# Altium schematic symbol library Regulator_Switching.SchLib: 1120 symbols (part 4 of 8)
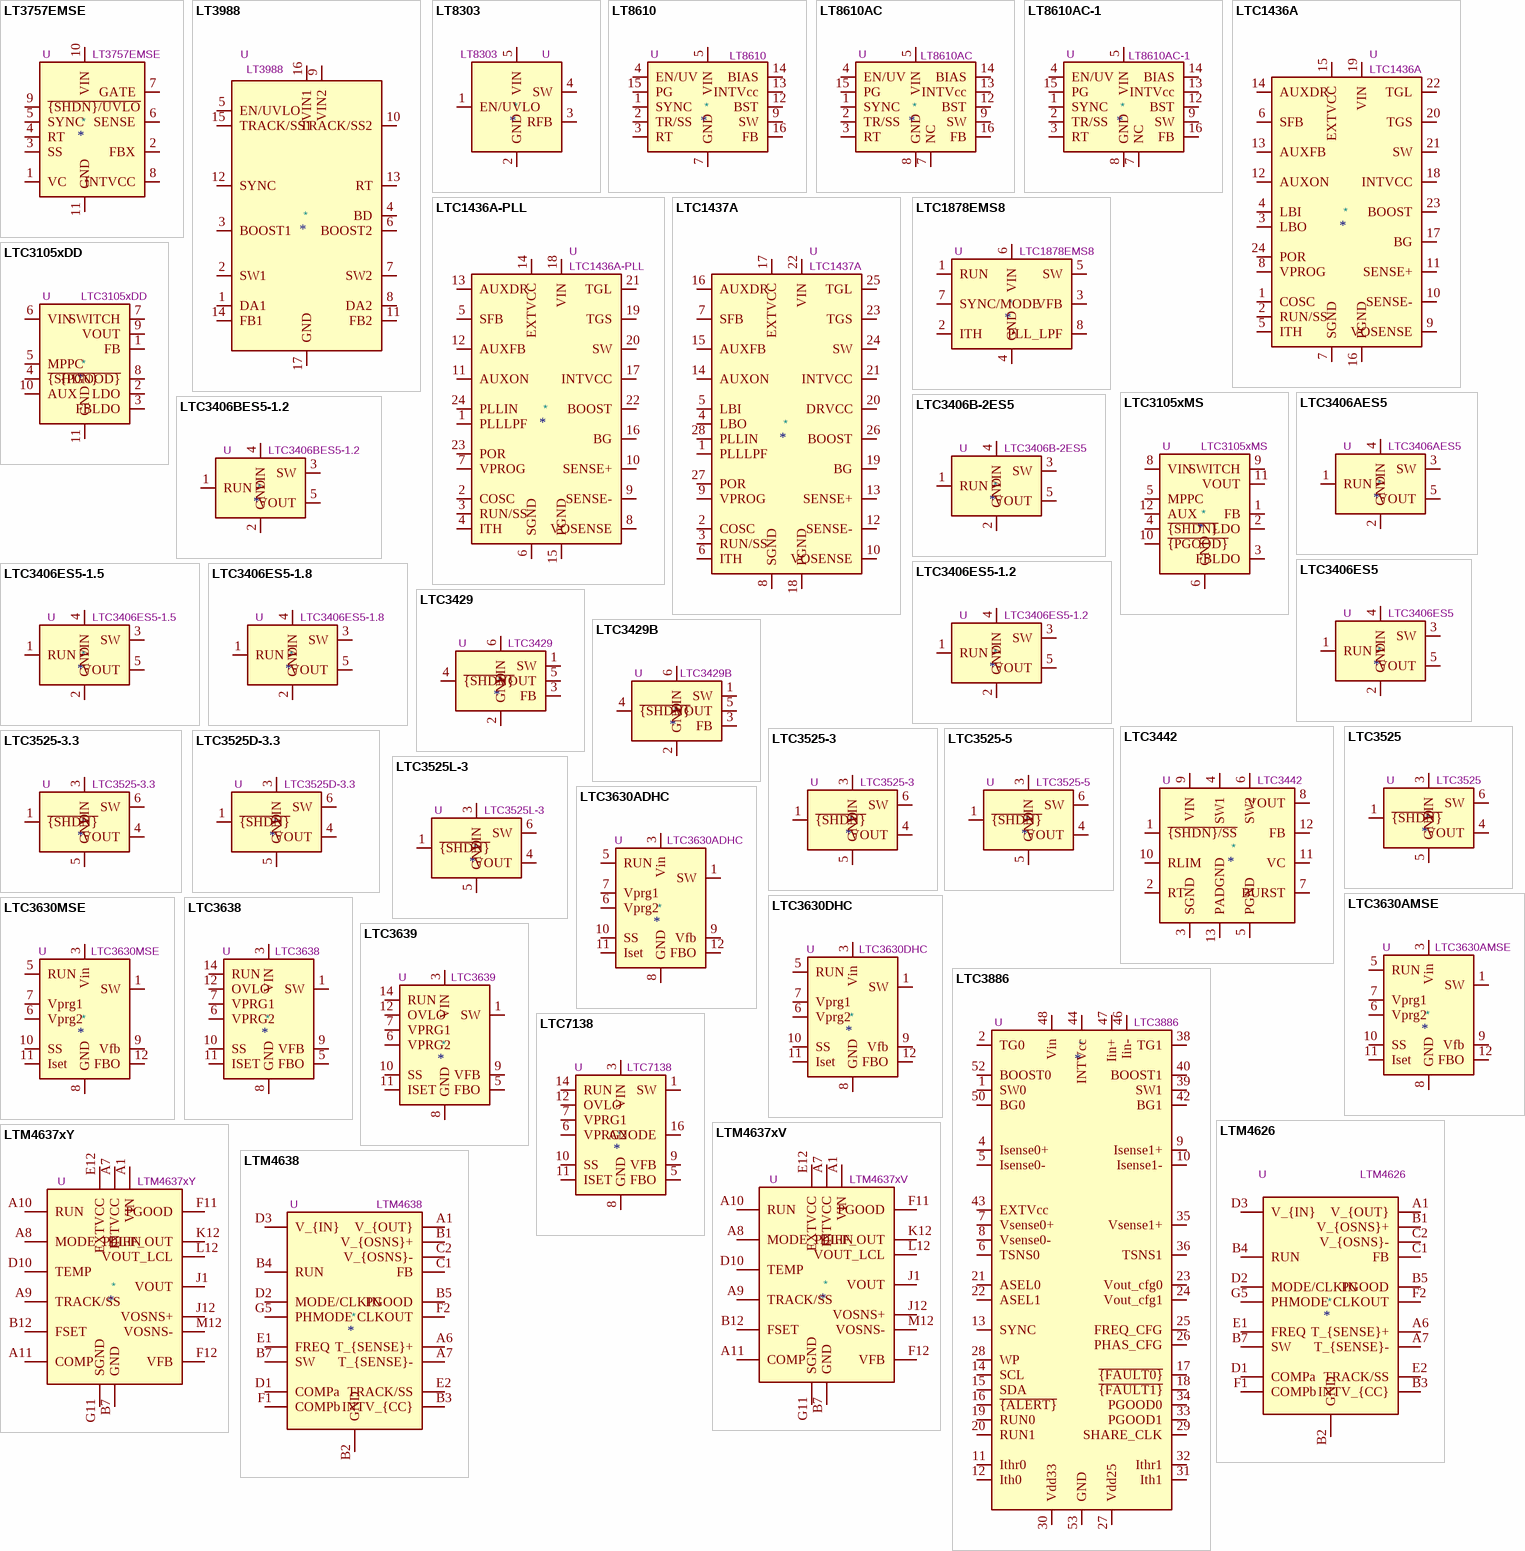
[diagram p30: symbols LT3757EMSE to LTM4638]

## LTC1878EMS8
designator *  value LTC1878EMS8  Reference: U
ki_keywords: Synchronous Step-Down Regulator; ki_description: High Efficiency Monolithic Synchronous Step-Down Regulator, MSOP-8; ki_fp_filters: MSOP*3x3mm*P0.65mm*; Footprint: Package_SO:MSOP-8_3x3mm_P0.65mm; Datasheet: https://www.analog.com/media/en/technical-documentation/data-sheets/1878f.pdf
pins: 1 RUN, 2 ITH, 3 VFB, 4 GND, 5 SW, 6 VIN, 7 SYNC/MODE, 8 PLL_LPF

## LTC3105xDD
designator *  value LTC3105xDD  Reference: U
ki_keywords: Solar MPPT Maximum Power Point Control Converter Step-Up; ki_description: 400mA Step-Up DC/DC Converter with Maximum Power Point Control and 250mV Start-Up, DFN-10; ki_fp_filters: DFN*EP*3x3mm*0.5mm*EP*; Footprint: Package_DFN_QFN:DFN-10-1EP_3x3mm_P0.5mm_EP1.65x2.38mm; Datasheet: https://www.analog.com/media/en/technical-documentation/data-sheets/3105fb.pdf
pins: 1 FB, 2 LDO, 3 FBLDO, 4 ~{{SHDN}}, 5 MPPC, 6 VIN, 7 SWITCH, 8 ~{{PGOOD}}, 9 VOUT, 10 AUX, 11 GND

## LTC3105xMS
designator *  value LTC3105xMS  Reference: U
ki_keywords: Solar MPPT Maximum Power Point Control Converter Step-Up; ki_description: 400mA Step-Up DC/DC Converter with Maximum Power Point Control and 250mV Start-Up, MSOP-12; ki_fp_filters: MSOP*3x4mm*0.65mm*; Footprint: Package_SO:MSOP-12_3x4mm_P0.65mm; Datasheet: https://www.analog.com/media/en/technical-documentation/data-sheets/3105fb.pdf
pins: 1 FB, 2 LDO, 3 FBLDO, 4 ~{{SHDN}}, 5 MPPC, 6 GND, 7 GND hidden, 8 VIN, 9 SWITCH, 10 ~{{PGOOD}}, 11 VOUT, 12 AUX

## LTC3406AES5
designator *  value LTC3406AES5  Reference: U
ki_keywords: Regulator step-down; ki_description: 600mA Synchronous Step-Down Regulator, 1.5MHz, Fixed 1.2V Output Voltage, Low Ripple Burst Mode, ThinSOT-23; ki_fp_filters: TSOT?23*; Footprint: Package_TO_SOT_SMD:TSOT-23-5; Datasheet: https://www.analog.com/media/en/technical-documentation/data-sheets/3406afa.pdf
pins: 1 RUN, 2 GND, 3 SW, 4 VIN, 5 VOUT

## LTC3406B-2ES5
designator *  value LTC3406B-2ES5  Reference: U
ki_keywords: Regulator step-down; ki_description: 600mA Synchronous Step-Down Regulator, 2.25MHz, Adjustable Output Voltage,ThinSOT-23; ki_fp_filters: TSOT?23*; Footprint: Package_TO_SOT_SMD:TSOT-23-5; Datasheet: https://www.analog.com/media/en/technical-documentation/data-sheets/3406b2fs.pdf
pins: 1 RUN, 2 GND, 3 SW, 4 VIN, 5 VOUT

## LTC3406BES5-1.2
designator *  value LTC3406BES5-1.2  Reference: U
ki_keywords: Regulator step-down; ki_description: 600mA Synchronous Step-Down Regulator, 1.5MHz, Fixed 1.2V Output Voltage, Burst Mode Disabled, ThinSOT-23; ki_fp_filters: TSOT?23*; Footprint: Package_TO_SOT_SMD:TSOT-23-5; Datasheet: https://www.analog.com/media/en/technical-documentation/data-sheets/3406b12fs.pdf
pins: 1 RUN, 2 GND, 3 SW, 4 VIN, 5 VOUT

## LTC3406ES5
designator *  value LTC3406ES5  Reference: U
ki_keywords: Regulator step-down; ki_description: 600mA Synchronous Step-Down Regulator, 1.5MHz, Adjustable Output Voltage, Burst Mode, ThinSOT-23; ki_fp_filters: TSOT?23*; Footprint: Package_TO_SOT_SMD:TSOT-23-5; Datasheet: https://www.analog.com/media/en/technical-documentation/data-sheets/3406b12fs.pdf
pins: 1 RUN, 2 GND, 3 SW, 4 VIN, 5 VOUT

## LTC3406ES5-1.2
designator *  value LTC3406ES5-1.2  Reference: U
ki_keywords: Regulator step-down; ki_description: 600mA Synchronous Step-Down Regulator, 1.5MHz, Fixed 1.2V Output Voltage, Burst Mode, ThinSOT-23; ki_fp_filters: TSOT?23*; Footprint: Package_TO_SOT_SMD:TSOT-23-5; Datasheet: https://www.analog.com/media/en/technical-documentation/data-sheets/3406b12fs.pdf
pins: 1 RUN, 2 GND, 3 SW, 4 VIN, 5 VOUT

## LTC3406ES5-1.5
designator *  value LTC3406ES5-1.5  Reference: U
ki_keywords: Regulator step-down; ki_description: 600mA Synchronous Step-Down Regulator, 1.5MHz, Fixed 1.5V Output Voltage, Burst Mode, ThinSOT-23; ki_fp_filters: TSOT?23*; Footprint: Package_TO_SOT_SMD:TSOT-23-5; Datasheet: https://www.analog.com/media/en/technical-documentation/data-sheets/3406b12fs.pdf
pins: 1 RUN, 2 GND, 3 SW, 4 VIN, 5 VOUT

## LTC3406ES5-1.8
designator *  value LTC3406ES5-1.8  Reference: U
ki_keywords: Regulator step-down; ki_description: 600mA Synchronous Step-Down Regulator, 1.5MHz, Fixed 1.8V Output Voltage, Burst Mode, ThinSOT-23; ki_fp_filters: TSOT?23*; Footprint: Package_TO_SOT_SMD:TSOT-23-5; Datasheet: https://www.analog.com/media/en/technical-documentation/data-sheets/3406b12fs.pdf
pins: 1 RUN, 2 GND, 3 SW, 4 VIN, 5 VOUT

## LTC3429
designator *  value LTC3429  Reference: U
ki_keywords: boost step-up DC/DC synchronous; ki_description: 600mA, 500kHz Micropower Synchronous Boost Converter with Output Disconnect, TSOT-23-6; ki_fp_filters: TSOT?23*; Footprint: Package_TO_SOT_SMD:TSOT-23-6; Datasheet: https://www.analog.com/media/en/technical-documentation/data-sheets/3429fa.pdf
pins: 1 SW, 2 GND, 3 FB, 4 ~{{SHDN}}, 5 VOUT, 6 VIN

## LTC3429B
designator *  value LTC3429B  Reference: U
ki_keywords: boost step-up DC/DC synchronous; ki_description: 600mA, 500kHz Micropower Synchronous Boost Converter with Output Disconnect, Continuous Switching at Light Loads, TSOT-23-6; ki_fp_filters: TSOT?23*; Footprint: Package_TO_SOT_SMD:TSOT-23-6; Datasheet: https://www.analog.com/media/en/technical-documentation/data-sheets/3429fa.pdf
pins: 1 SW, 2 GND, 3 FB, 4 ~{{SHDN}}, 5 VOUT, 6 VIN

## LTC3442
designator *  value LTC3442  Reference: U
ki_keywords: Micropower Synchronous Buck-Boost DC/DC Converter; ki_description: Micropower Synchronous Buck-Boost DC/DC Converter with Automatic Burst Mode Operation, DFN-12; ki_fp_filters: DFN*EP*3x4mm*P0.5mm*; Footprint: Package_DFN_QFN:DFN-12-1EP_3x4mm_P0.5mm_EP1.7x3.3mm; Datasheet: https://www.analog.com/media/en/technical-documentation/data-sheets/3442fb.pdf
pins: 1 ~{{SHDN}/SS}, 2 RT, 3 SGND, 4 SW1, 5 PGND, 6 SW2, 7 BURST, 8 VOUT, 9 VIN, 10 RLIM, 11 VC, 12 FB, 13 PADGND

## LTC3525
designator *  value LTC3525  Reference: U
ki_keywords: boost step-up DC/DC synchronous; ki_description: 400mA Micropower Synchronous Step-Up DC/DC Converter with Output Disconnect, SC-70-6; ki_fp_filters: *SC?70* SOT?363*; Footprint: Package_TO_SOT_SMD:SOT-363_SC-70-6; Datasheet: https://www.analog.com/media/en/technical-documentation/data-sheets/3525fc.pdf
pins: 1 ~{{SHDN}}, 2 GND hidden, 3 VIN, 4 VOUT, 5 GND, 6 SW

## LTC3525-3
designator *  value LTC3525-3  Reference: U
ki_keywords: fixed boost step-up DC/DC synchronous; ki_description: Fixed 3V, 400mA Micropower Synchronous Step-Up DC/DC Converter with Output Disconnect, SC-70-6; ki_fp_filters: *SC?70* SOT?363*; Footprint: Package_TO_SOT_SMD:SOT-363_SC-70-6; Datasheet: https://www.analog.com/media/en/technical-documentation/data-sheets/3525fc.pdf
pins: 1 ~{{SHDN}}, 2 GND hidden, 3 VIN, 4 VOUT, 5 GND, 6 SW

## LTC3525-3.3
designator *  value LTC3525-3.3  Reference: U
ki_keywords: fixed boost step-up DC/DC synchronous; ki_description: Fixed 3V3, 400mA Micropower Synchronous Step-Up DC/DC Converter with Output Disconnect, SC-70-6; ki_fp_filters: *SC?70* SOT?363*; Footprint: Package_TO_SOT_SMD:SOT-363_SC-70-6; Datasheet: https://www.analog.com/media/en/technical-documentation/data-sheets/3525fc.pdf
pins: 1 ~{{SHDN}}, 2 GND hidden, 3 VIN, 4 VOUT, 5 GND, 6 SW

## LTC3525-5
designator *  value LTC3525-5  Reference: U
ki_keywords: fixed boost step-up DC/DC synchronous; ki_description: Fixed 5V, 400mA Micropower Synchronous Step-Up DC/DC Converter with Output Disconnect, SC-70-6; ki_fp_filters: *SC?70* SOT?363*; Footprint: Package_TO_SOT_SMD:SOT-363_SC-70-6; Datasheet: https://www.analog.com/media/en/technical-documentation/data-sheets/3525fc.pdf
pins: 1 ~{{SHDN}}, 2 GND hidden, 3 VIN, 4 VOUT, 5 GND, 6 SW

## LTC3525D-3.3
designator *  value LTC3525D-3.3  Reference: U
ki_keywords: fixed boost step-up DC/DC synchronous; ki_description: Fixed 3V3, 400mA Micropower Synchronous Step-Up DC/DC Converter with Pass Through Mode, SC-70-6; ki_fp_filters: *SC?70* SOT?363*; Footprint: Package_TO_SOT_SMD:SOT-363_SC-70-6; Datasheet: https://www.analog.com/media/en/technical-documentation/data-sheets/3525d33fb.pdf
pins: 1 ~{{SHDN}}, 2 GND hidden, 3 VIN, 4 VOUT, 5 GND, 6 SW

## LTC3525L-3
designator *  value LTC3525L-3  Reference: U
ki_keywords: fixed boost step-up DC/DC synchronous; ki_description: Fixed 3V, 400mA Micropower Synchronous Step-Up DC/DC Converter with Output Disconnect, SC-70-6; ki_fp_filters: *SC?70* SOT?363*; Footprint: Package_TO_SOT_SMD:SOT-363_SC-70-6; Datasheet: https://www.analog.com/media/en/technical-documentation/data-sheets/3525laf.pdf
pins: 1 ~{{SHDN}}, 2 GND hidden, 3 VIN, 4 VOUT, 5 GND, 6 SW

## LTC3630ADHC
designator *  value LTC3630ADHC  Reference: U
ki_keywords: buck dc-dc switcher switching; ki_description: High efficiency 76V 500mA synchronous step-down converter, DFN-16; ki_fp_filters: DFN*EP*3x5mm*P0.5mm*; Footprint: Package_DFN_QFN:DFN-16-1EP_3x5mm_P0.5mm_EP1.66x4.4mm; Datasheet: https://www.analog.com/media/en/technical-documentation/data-sheets/3630afc.pdf
pins: 1 SW, 2 NC hidden, 3 Vin, 4 NC hidden, 5 RUN, 6 Vprg2, 7 Vprg1, 8 GND, 9 Vfb, 10 SS, 11 Iset, 12 FBO, 13 NC hidden, 14 GND hidden, 15 NC hidden, 16 GND hidden, 17 GND hidden

## LTC3630AMSE
designator *  value LTC3630AMSE  Reference: U
ki_keywords: buck dc-dc switcher switching; ki_description: High efficiency 76V 500mA synchronous step-down converter, MSOP-16(12); ki_fp_filters: Linear*MSOP*12*16*EP*3x4mm*P0.5mm*; Footprint: Package_SO:Linear_MSOP-12-16-1EP_3x4mm_P0.5mm; Datasheet: https://www.analog.com/media/en/technical-documentation/data-sheets/3630afc.pdf
pins: 1 SW, 3 Vin, 5 RUN, 6 Vprg2, 7 Vprg1, 8 GND, 9 Vfb, 10 SS, 11 Iset, 12 FBO, 14 GND hidden, 16 GND hidden, 17 GND hidden

## LTC3630DHC
designator *  value LTC3630DHC  Reference: U
ki_keywords: buck dc-dc switcher switching; ki_description: 500mA High efficiency 65V synchronous step-down converter, DFN-16; ki_fp_filters: DFN*EP*3x5mm*P0.5mm*; Footprint: Package_DFN_QFN:DFN-16-1EP_3x5mm_P0.5mm_EP1.66x4.4mm; Datasheet: https://www.analog.com/media/en/technical-documentation/data-sheets/3630fd.pdf
pins: 1 SW, 2 NC hidden, 3 Vin, 4 NC hidden, 5 RUN, 6 Vprg2, 7 Vprg1, 8 GND, 9 Vfb, 10 SS, 11 Iset, 12 FBO, 13 NC hidden, 14 GND hidden, 15 NC hidden, 16 GND hidden, 17 GND hidden

## LTC3630MSE
designator *  value LTC3630MSE  Reference: U
ki_keywords: buck dc-dc switcher switching; ki_description: 500mA High efficiency 65V synchronous step-down converter, MSOP-16(12); ki_fp_filters: Linear*MSOP*12*16*EP*3x4mm*P0.5mm*; Footprint: Package_SO:Linear_MSOP-12-16-1EP_3x4mm_P0.5mm; Datasheet: https://www.analog.com/media/en/technical-documentation/data-sheets/3630fd.pdf
pins: 1 SW, 3 Vin, 5 RUN, 6 Vprg2, 7 Vprg1, 8 GND, 9 Vfb, 10 SS, 11 Iset, 12 FBO, 14 GND hidden, 16 GND hidden, 17 GND hidden

## LTC3638
designator *  value LTC3638  Reference: U
ki_keywords: buck dc-dc switcher switching; ki_description: 250mA High efficiency 140V step-down converter, MSOP-16(12); ki_fp_filters: Linear*MSOP*12*16*EP*3x4mm*P0.5mm*; Footprint: Package_SO:Linear_MSOP-12-16-1EP_3x4mm_P0.5mm; Datasheet: https://www.analog.com/media/en/technical-documentation/data-sheets/3638fa.pdf
pins: 1 SW, 3 VIN, 5 FBO, 6 VPRG2, 7 VPRG1, 8 GND, 9 VFB, 10 SS, 11 ISET, 12 OVLO, 14 RUN, 16 GND hidden, 17 GND hidden

## LTC3639
designator *  value LTC3639  Reference: U
ki_keywords: buck dc-dc switcher switching; ki_description: 100mA High efficiency 150V syncrhonous step-down converter, MSOP-16(12); ki_fp_filters: Linear*MSOP*12*16*EP*3x4mm*P0.5mm*; Footprint: Package_SO:Linear_MSOP-12-16-1EP_3x4mm_P0.5mm; Datasheet: https://www.analog.com/media/en/technical-documentation/data-sheets/3639fd.pdf
pins: 1 SW, 3 VIN, 5 FBO, 6 VPRG2, 7 VPRG1, 8 GND, 9 VFB, 10 SS, 11 ISET, 12 OVLO, 14 RUN, 16 GND hidden, 17 GND hidden

## LTC3886
designator *  value LTC3886  Reference: U
ki_keywords: step down switch manager I2C telemetry fault current sense; ki_description: 60V dual output buck output with digital power system management, UKG52(46); ki_fp_filters: Linear*UGK52*QFN*46*52*; Footprint: Package_DFN_QFN:Linear_UGK52_QFN-46-52; Datasheet: https://www.analog.com/media/en/technical-documentation/data-sheets/LTC3886-3886-1.pdf
pins: 1 SW0, 2 TG0, 4 Isense0+, 5 Isense0-, 6 TSNS0, 7 Vsense0+, 8 Vsense0-, 9 Isense1+, 10 Isense1-, 11 Ithr0, 12 Ith0, 13 SYNC, 14 SCL, 15 SDA, 16 ~{{ALERT}}, 17 ~{{FAULT0}}, 18 ~{{FAULT1}}, 19 RUN0, 20 RUN1, 21 ASEL0, 22 ASEL1, 23 Vout_cfg0, 24 Vout_cfg1, 25 FREQ_CFG, 26 PHAS_CFG, 27 Vdd25, 28 WP, 29 SHARE_CLK, 30 Vdd33, 31 Ith1, 32 Ithr1, 33 PGOOD1, 34 PGOOD0, 35 Vsense1+, 36 TSNS1, 38 TG1, 39 SW1, 40 BOOST1, 42 BG1, 43 EXTVcc, 44 INTVcc, 46 Iin-, 47 Iin+, 48 Vin, 50 BG0, 52 BOOST0, 53 GND

## LTC7138
designator *  value LTC7138  Reference: U
ki_keywords: buck dc-dc switcher switching; ki_description: 400mA High efficiency 140V step-down converter, MSOP-16(12); ki_fp_filters: Linear*MSOP*12*16*EP*3x4mm*P0.5mm*; Footprint: Package_SO:Linear_MSOP-12-16-1EP_3x4mm_P0.5mm; Datasheet: https://www.analog.com/media/en/technical-documentation/data-sheets/7138f.pdf
pins: 1 SW, 3 VIN, 5 FBO, 6 VPRG2, 7 VPRG1, 8 GND, 9 VFB, 10 SS, 11 ISET, 12 OVLO, 14 RUN, 16 ANODE, 17 GND hidden

## LTM4626
designator *  value LTM4626  Reference: U
ki_keywords: uModule Buck Regulator; ki_description: Analog Devices 20VIN, 12A Step-Down DC/DC uModule Regulator, BGA-49; ki_fp_filters: *BGA*6.25x6.25mm*Layout7x7*P0.8mm*; Footprint: Package_BGA:Analog_BGA-49_6.25x6.25mm_Layout7x7_P0.8mm_Ball0.5mm_Pad0.4mm; Datasheet: https://www.analog.com/media/en/technical-documentation/data-sheets/ltm4626.pdf
pins: A1 V_{OUT}, A2 V_{OUT} hidden, A3 V_{OUT} hidden, A4 V_{OUT} hidden, A5 V_{OUT} hidden, A6 T_{SENSE}+, A7 T_{SENSE}-, B1 V_{OSNS}+, B2 GND, B3 INTV_{CC}, B4 RUN, B5 PGOOD, B6 GND hidden, B7 SW, C1 FB, C2 V_{OSNS}-, C3 GND hidden, C4 GND hidden, C5 GND hidden, C6 GND hidden, C7 GND hidden, D1 COMPa, D2 MODE/CLKIN, D3 V_{IN}, D4 V_{IN} hidden, D5 GND hidden, D6 GND hidden, D7 GND hidden, E1 FREQ, E2 TRACK/SS, E3 V_{IN} hidden, E4 V_{IN} hidden, E5 GND hidden, E6 GND hidden, E7 GND hidden, F1 COMPb, F2 CLKOUT, F3 V_{OUT} hidden, F4 V_{IN} hidden, F5 GND hidden, F6 GND hidden, F7 GND hidden, G1 V_{OUT} hidden, G2 V_{OUT} hidden, G3 V_{OUT} hidden, G4 V_{IN} hidden, G5 PHMODE, G6 GND hidden, G7 GND hidden

## LTM4637xV
designator *  value LTM4637xV  Reference: U
ki_keywords: uModule DCDC; ki_description: 20A DC/DC µModule Step-Down Regulator, LGA-133; ki_fp_filters: Linear*LGA*15.0x15.0mm*Layout12x12*P1.27mm*; Footprint: Package_LGA:Linear_LGA-133_15.0x15.0mm_Layout12x12_P1.27mm; Datasheet: https://www.analog.com/media/en/technical-documentation/data-sheets/4637fc.pdf
pins: A1 VIN, A2 VIN hidden, A3 VIN hidden, A4 VIN hidden, A5 VIN hidden, A6 VIN hidden, A7 INTVCC, A8 MODE_PLLIN, A9 TRACK/SS, A10 RUN, A11 COMP, A12 MTP1 hidden, B1 VIN hidden, B2 VIN hidden, B3 VIN hidden, B4 VIN hidden, B5 VIN hidden, B6 VIN hidden, B7 GND, B9 GND hidden, B11 MTP2 hidden, B12 FSET, C1 VIN hidden, C2 VIN hidden, C3 VIN hidden, C4 VIN hidden, C5 VIN hidden, C6 VIN hidden, C7 GND hidden, C9 GND hidden, C10 MTP3 hidden, C11 MTP4 hidden, C12 MTP5 hidden, D1 GND hidden, D2 GND hidden, D3 GND hidden, D4 GND hidden, D5 GND hidden, D6 GND hidden, D8 GND hidden, D9 INTVCC hidden, D10 TEMP, D11 MTP6 hidden, D12 MTP7 hidden, E1 GND hidden, E2 GND hidden, E3 GND hidden, E4 GND hidden, E5 GND hidden, E6 GND hidden, E7 GND hidden, E9 GND hidden, E12 EXTVCC, F1 GND hidden, F2 GND hidden, F3 GND hidden, F4 GND hidden, F5 GND hidden, F6 GND hidden, F7 GND hidden, F8 GND hidden, F9 GND hidden, F11 PGOOD, F12 VFB, G1 GND hidden, G2 GND hidden, G3 GND hidden, G4 GND hidden, G5 GND hidden, G6 GND hidden, G7 GND hidden, G8 GND hidden, G9 GND hidden, G11 SGND, G12 PGOOD hidden, H1 GND hidden, H2 GND hidden, H3 GND hidden, H4 GND hidden, H5 GND hidden, H6 GND hidden, H7 GND hidden, H8 GND hidden, H9 GND hidden, H11 SGND hidden, H12 SGND hidden, J1 VOUT, J2 VOUT hidden, J3 VOUT hidden, J4 VOUT hidden, J5 VOUT hidden, J6 VOUT hidden, J7 VOUT hidden, J8 VOUT hidden, J9 VOUT hidden, J10 VOUT hidden, J12 VOSNS+, K1 VOUT hidden, K2 VOUT hidden, K3 VOUT hidden, K4 VOUT hidden, K5 VOUT hidden, K6 VOUT hidden, K7 VOUT hidden, K8 VOUT hidden, K9 VOUT hidden, K10 VOUT hidden, K11 VOUT hidden, K12 DIFF_OUT, L1 VOUT hidden, L2 VOUT hidden, L3 VOUT hidden, L4 VOUT hidden, L5 VOUT hidden, L6 VOUT hidden, L7 VOUT hidden, L8 VOUT hidden, L9 VOUT hidden, L10 VOUT hidden, L11 VOUT hidden, L12 VOUT_LCL, M1 VOUT hidden, M2 VOUT hidden, M3 VOUT hidden, M4 VOUT hidden, M5 VOUT hidden, M6 VOUT hidden, M7 VOUT hidden, M8 VOUT hidden, M9 VOUT hidden, M10 VOUT hidden, M11 VOUT hidden, M12 VOSNS-

## LTM4637xY
designator *  value LTM4637xY  Reference: U
ki_keywords: uModule DCDC; ki_description: 20A DC/DC µModule Step-Down Regulator, BGA-133; ki_fp_filters: Linear*BGA*15.0x15.0mm*Layout12x12*P1.27mm*; Footprint: Package_BGA:Linear_BGA-133_15.0x15.0mm_Layout12x12_P1.27mm; Datasheet: https://www.analog.com/media/en/technical-documentation/data-sheets/4637fc.pdf
pins: A1 VIN, A2 VIN hidden, A3 VIN hidden, A4 VIN hidden, A5 VIN hidden, A6 VIN hidden, A7 INTVCC, A8 MODE_PLLIN, A9 TRACK/SS, A10 RUN, A11 COMP, A12 MTP1 hidden, B1 VIN hidden, B2 VIN hidden, B3 VIN hidden, B4 VIN hidden, B5 VIN hidden, B6 VIN hidden, B7 GND, B9 GND hidden, B11 MTP2 hidden, B12 FSET, C1 VIN hidden, C2 VIN hidden, C3 VIN hidden, C4 VIN hidden, C5 VIN hidden, C6 VIN hidden, C7 GND hidden, C9 GND hidden, C10 MTP3 hidden, C11 MTP4 hidden, C12 MTP5 hidden, D1 GND hidden, D2 GND hidden, D3 GND hidden, D4 GND hidden, D5 GND hidden, D6 GND hidden, D8 GND hidden, D9 INTVCC hidden, D10 TEMP, D11 MTP6 hidden, D12 MTP7 hidden, E1 GND hidden, E2 GND hidden, E3 GND hidden, E4 GND hidden, E5 GND hidden, E6 GND hidden, E7 GND hidden, E9 GND hidden, E12 EXTVCC, F1 GND hidden, F2 GND hidden, F3 GND hidden, F4 GND hidden, F5 GND hidden, F6 GND hidden, F7 GND hidden, F8 GND hidden, F9 GND hidden, F11 PGOOD, F12 VFB, G1 GND hidden, G2 GND hidden, G3 GND hidden, G4 GND hidden, G5 GND hidden, G6 GND hidden, G7 GND hidden, G8 GND hidden, G9 GND hidden, G11 SGND, G12 PGOOD hidden, H1 GND hidden, H2 GND hidden, H3 GND hidden, H4 GND hidden, H5 GND hidden, H6 GND hidden, H7 GND hidden, H8 GND hidden, H9 GND hidden, H11 SGND hidden, H12 SGND hidden, J1 VOUT, J2 VOUT hidden, J3 VOUT hidden, J4 VOUT hidden, J5 VOUT hidden, J6 VOUT hidden, J7 VOUT hidden, J8 VOUT hidden, J9 VOUT hidden, J10 VOUT hidden, J12 VOSNS+, K1 VOUT hidden, K2 VOUT hidden, K3 VOUT hidden, K4 VOUT hidden, K5 VOUT hidden, K6 VOUT hidden, K7 VOUT hidden, K8 VOUT hidden, K9 VOUT hidden, K10 VOUT hidden, K11 VOUT hidden, K12 DIFF_OUT, L1 VOUT hidden, L2 VOUT hidden, L3 VOUT hidden, L4 VOUT hidden, L5 VOUT hidden, L6 VOUT hidden, L7 VOUT hidden, L8 VOUT hidden, L9 VOUT hidden, L10 VOUT hidden, L11 VOUT hidden, L12 VOUT_LCL, M1 VOUT hidden, M2 VOUT hidden, M3 VOUT hidden, M4 VOUT hidden, M5 VOUT hidden, M6 VOUT hidden, M7 VOUT hidden, M8 VOUT hidden, M9 VOUT hidden, M10 VOUT hidden, M11 VOUT hidden, M12 VOSNS-

## LTM4638
designator *  value LTM4638  Reference: U
ki_keywords: uModule Buck Regulator; ki_description: Analog Devices 20VIN, 15A Step-Down DC/DC uModule Regulator, BGA-49; ki_fp_filters: *BGA*6.25x6.25mm*Layout7x7*P0.8mm*; Footprint: Package_BGA:Analog_BGA-49_6.25x6.25mm_Layout7x7_P0.8mm_Ball0.5mm_Pad0.4mm; Datasheet: https://www.analog.com/media/en/technical-documentation/data-sheets/ltm4638.pdf
pins: A1 V_{OUT}, A2 V_{OUT} hidden, A3 V_{OUT} hidden, A4 V_{OUT} hidden, A5 V_{OUT} hidden, A6 T_{SENSE}+, A7 T_{SENSE}-, B1 V_{OSNS}+, B2 GND, B3 INTV_{CC}, B4 RUN, B5 PGOOD, B6 GND hidden, B7 SW, C1 FB, C2 V_{OSNS}-, C3 GND hidden, C4 GND hidden, C5 GND hidden, C6 GND hidden, C7 GND hidden, D1 COMPa, D2 MODE/CLKIN, D3 V_{IN}, D4 V_{IN} hidden, D5 GND hidden, D6 GND hidden, D7 GND hidden, E1 FREQ, E2 TRACK/SS, E3 V_{IN} hidden, E4 V_{IN} hidden, E5 GND hidden, E6 GND hidden, E7 GND hidden, F1 COMPb, F2 CLKOUT, F3 V_{OUT} hidden, F4 V_{IN} hidden, F5 GND hidden, F6 GND hidden, F7 GND hidden, G1 V_{OUT} hidden, G2 V_{OUT} hidden, G3 V_{OUT} hidden, G4 V_{IN} hidden, G5 PHMODE, G6 GND hidden, G7 GND hidden

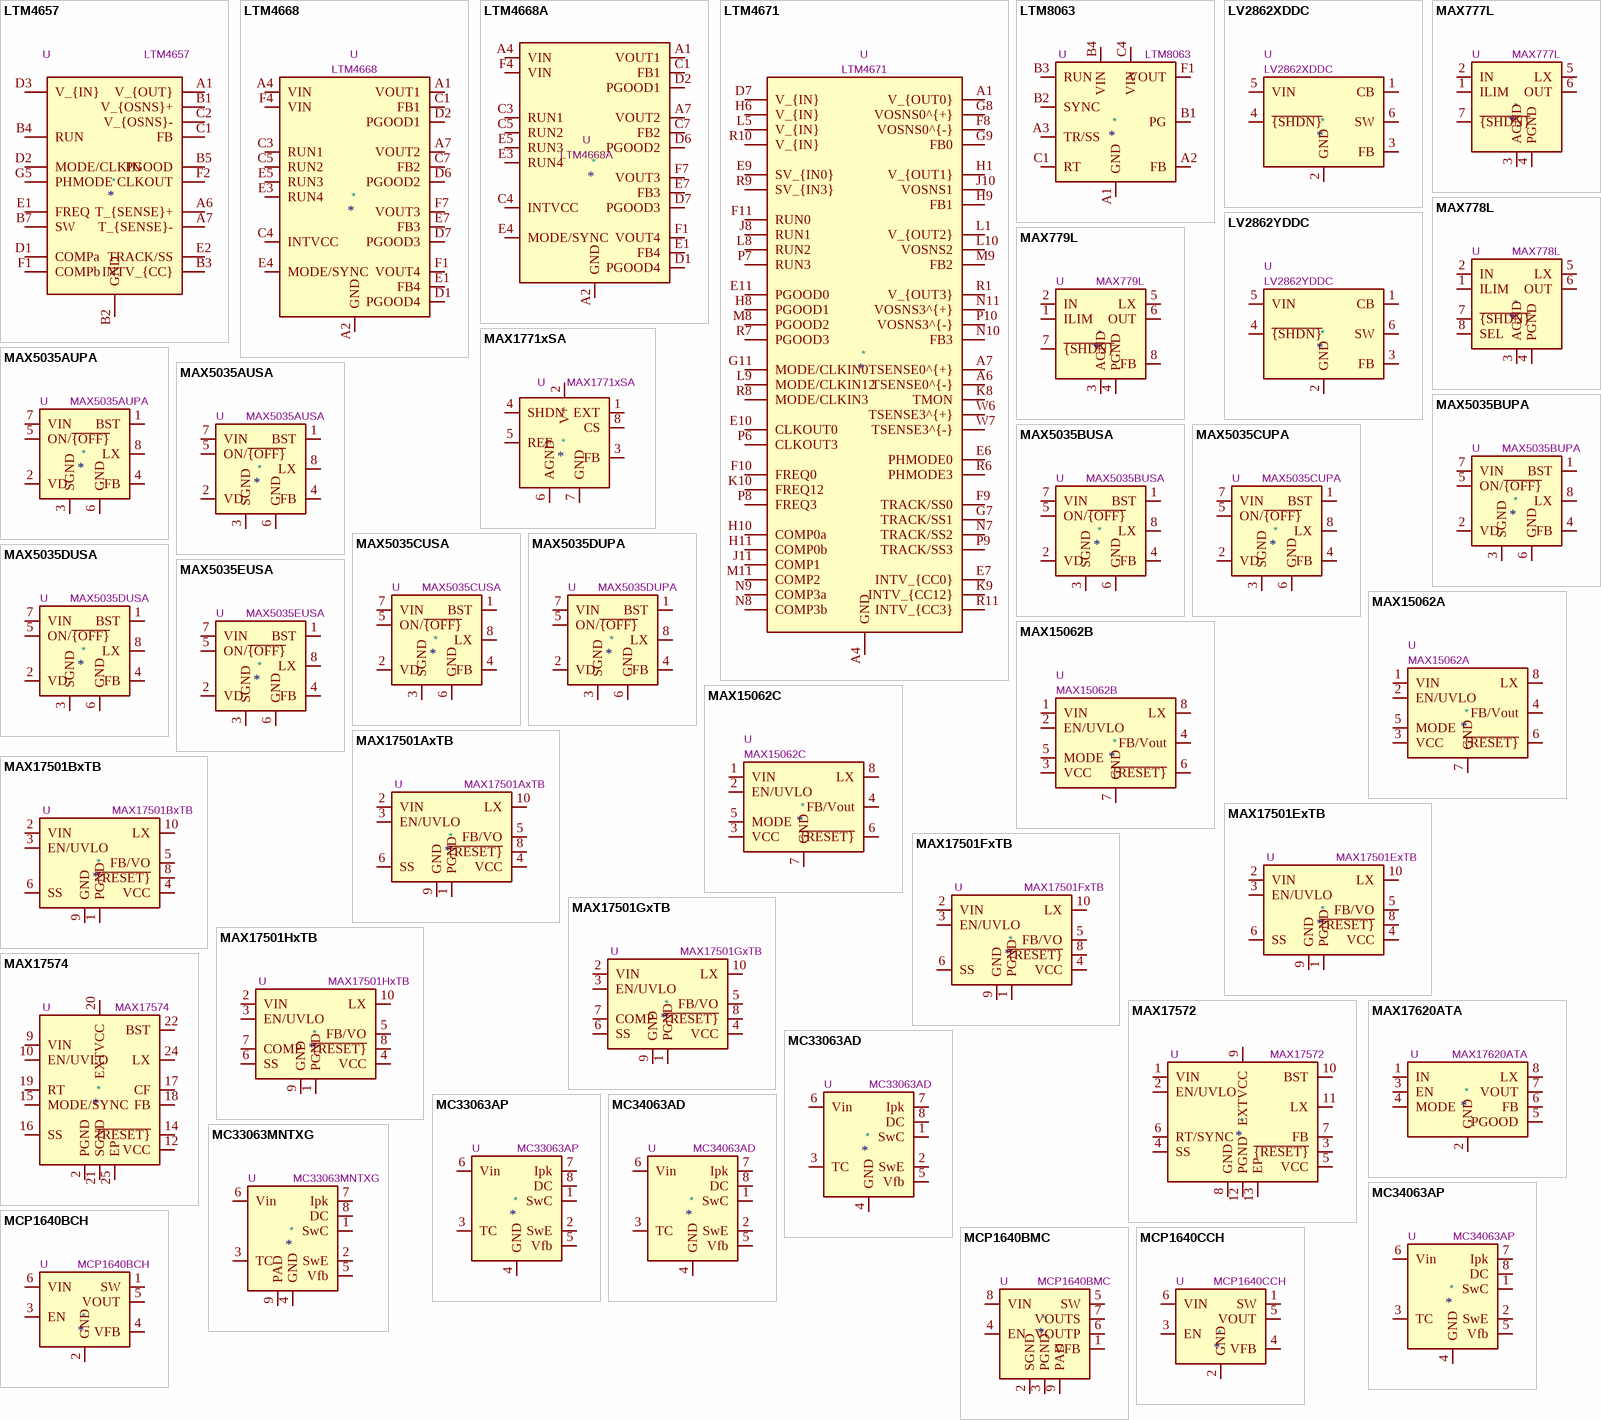
[diagram p13: symbols LTM4657 to MCP1640CCH]

## LTM4657
designator *  value LTM4657  Reference: U
ki_keywords: uModule Buck Regulator; ki_description: Analog Devices 20VIN, 8A Step-Down DC/DC uModule Regulator, BGA-49; ki_fp_filters: *BGA*6.25x6.25mm*Layout7x7*P0.8mm*; Footprint: Package_BGA:Analog_BGA-49_6.25x6.25mm_Layout7x7_P0.8mm_Ball0.5mm_Pad0.4mm; Datasheet: https://www.analog.com/media/en/technical-documentation/data-sheets/ltm4657.pdf
pins: A1 V_{OUT}, A2 V_{OUT} hidden, A3 V_{OUT} hidden, A4 V_{OUT} hidden, A5 V_{OUT} hidden, A6 T_{SENSE}+, A7 T_{SENSE}-, B1 V_{OSNS}+, B2 GND, B3 INTV_{CC}, B4 RUN, B5 PGOOD, B6 GND hidden, B7 SW, C1 FB, C2 V_{OSNS}-, C3 GND hidden, C4 GND hidden, C5 GND hidden, C6 GND hidden, C7 GND hidden, D1 COMPa, D2 MODE/CLKIN, D3 V_{IN}, D4 V_{IN} hidden, D5 GND hidden, D6 GND hidden, D7 GND hidden, E1 FREQ, E2 TRACK/SS, E3 V_{IN} hidden, E4 V_{IN} hidden, E5 GND hidden, E6 GND hidden, E7 GND hidden, F1 COMPb, F2 CLKOUT, F3 V_{OUT} hidden, F4 V_{IN} hidden, F5 GND hidden, F6 GND hidden, F7 GND hidden, G1 V_{OUT} hidden, G2 V_{OUT} hidden, G3 V_{OUT} hidden, G4 V_{IN} hidden, G5 PHMODE, G6 GND hidden, G7 GND hidden

## LTM4668
designator *  value LTM4668  Reference: U
ki_keywords: uModule DCDC; ki_description: Quad DC/DC μModule Regulator with Configurable 1.2A Output Array; ki_fp_filters: *BGA*6.25x6.25mm*Layout7x7*P0.8mm*; Footprint: Package_BGA:Analog_BGA-49_6.25x6.25mm_Layout7x7_P0.8mm_Ball0.5mm_Pad0.4mm; Datasheet: https://www.analog.com/media/en/technical-documentation/data-sheets/ltm4668.pdf
pins: A1 VOUT1, A2 GND, A3 GND hidden, A4 VIN, A5 GND hidden, A6 GND hidden, A7 VOUT2, B1 VOUT1 hidden, B2 GND hidden, B3 GND hidden, B4 VIN hidden, B5 GND hidden, B6 GND hidden, B7 VOUT2 hidden, C1 FB1, C2 GND hidden, C3 RUN1, C4 INTVCC, C5 RUN2, C6 GND hidden, C7 FB2, D1 PGOOD4, D2 PGOOD1, D3 GND hidden, D4 GND hidden, D5 GND hidden, D6 PGOOD2, D7 PGOOD3, E1 FB4, E2 GND hidden, E3 RUN4, E4 MODE/SYNC, E5 RUN3, E6 GND hidden, E7 FB3, F1 VOUT4, F2 GND hidden, F3 GND hidden, F4 VIN, F5 GND hidden, F6 GND hidden, F7 VOUT3, G1 VOUT4 hidden, G2 GND hidden, G3 GND hidden, G4 VIN hidden, G5 GND hidden, G6 GND hidden, G7 VOUT3 hidden

## LTM4668A
designator *  value LTM4668A  Reference: U
ki_keywords: uModule DCDC; ki_description: Quad DC/DC μModule Regulator with Configurable 1.2A Output Array; ki_fp_filters: *BGA*6.25x6.25mm*Layout7x7*P0.8mm*; Footprint: Package_BGA:Analog_BGA-49_6.25x6.25mm_Layout7x7_P0.8mm_Ball0.5mm_Pad0.4mm; Datasheet: https://www.analog.com/media/en/technical-documentation/data-sheets/ltm4668a.pdf
pins: A1 VOUT1, A2 GND, A3 GND hidden, A4 VIN, A5 GND hidden, A6 GND hidden, A7 VOUT2, B1 VOUT1 hidden, B2 GND hidden, B3 GND hidden, B4 VIN hidden, B5 GND hidden, B6 GND hidden, B7 VOUT2 hidden, C1 FB1, C2 GND hidden, C3 RUN1, C4 INTVCC, C5 RUN2, C6 GND hidden, C7 FB2, D1 PGOOD4, D2 PGOOD1, D3 GND hidden, D4 GND hidden, D5 GND hidden, D6 PGOOD2, D7 PGOOD3, E1 FB4, E2 GND hidden, E3 RUN4, E4 MODE/SYNC, E5 RUN3, E6 GND hidden, E7 FB3, F1 VOUT4, F2 GND hidden, F3 GND hidden, F4 VIN, F5 GND hidden, F6 GND hidden, F7 VOUT3, G1 VOUT4 hidden, G2 GND hidden, G3 GND hidden, G4 VIN hidden, G5 GND hidden, G6 GND hidden, G7 VOUT3 hidden

## LTM4671
designator *  value LTM4671  Reference: U
ki_keywords: uModule DCDC; ki_description: Quad DC/DC uModule Regulator with Configurable Dual 0.6-3.3V/12A, Dual 0.6-5.5V/5A Output Array, 3.1-20Vin (BGA-209); ki_fp_filters: *BGA*9.5x16mm*Layout11x19*P0.8mm*; Footprint: Package_BGA:Analog_BGA-209_9.5x16mm_Layout11x19_P0.8mm_Ball0.5mm_Pad0.4mm; Datasheet: https://www.analog.com/media/en/technical-documentation/data-sheets/LTM4671.pdf
pins: A1 V_{OUT0}, A2 V_{OUT0} hidden, A3 V_{OUT0} hidden, A4 GND, A5 GND hidden, A6 TSENSE0^{-}, A7 TSENSE0^{+}, A8 GND hidden, A9 GND hidden, A10 GND hidden, A11 GND hidden, B1 V_{OUT0} hidden, B2 V_{OUT0} hidden, B3 V_{OUT0} hidden, B4 GND hidden, B5 GND hidden, B6 GND hidden, B7 GND hidden, B8 GND hidden, B9 GND hidden, B10 GND hidden, B11 GND hidden, C1 V_{OUT0} hidden, C2 V_{OUT0} hidden, C3 V_{OUT0} hidden, C4 GND hidden, C5 GND hidden, C6 GND hidden, C7 GND hidden, C8 GND hidden, C9 GND hidden, C10 GND hidden, C11 GND hidden, D1 V_{OUT0} hidden, D2 V_{OUT0} hidden, D3 V_{OUT0} hidden, D4 GND hidden, D5 GND hidden, D6 GND hidden, D7 V_{IN}, D8 V_{IN} hidden, D9 V_{IN} hidden, D10 V_{IN} hidden, D11 V_{IN} hidden, E1 V_{OUT0} hidden, E2 V_{OUT0} hidden, E3 GND hidden, E4 GND hidden, E5 GND hidden, E6 PHMODE0, E7 INTV_{CC0}, E8 V_{IN} hidden, E9 SV_{IN0}, E10 CLKOUT0, E11 PGOOD0, F1 GND hidden, F2 GND hidden, F3 GND hidden, F4 GND hidden, F5 GND hidden, F6 GND hidden, F7 GND hidden, F8 VOSNS0^{-}, F9 TRACK/SS0, F10 FREQ0, F11 RUN0, G1 GND hidden, G2 GND hidden, G3 GND hidden, G4 GND hidden, G5 GND hidden, G6 GND hidden, G7 TRACK/SS1, G8 VOSNS0^{+}, G9 FB0, G10 GND hidden, G11 MODE/CLKIN0, H1 V_{OUT1}, H2 V_{OUT1} hidden, H3 V_{OUT1} hidden, H4 V_{OUT1} hidden, H5 GND hidden, H6 V_{IN}, H7 GND hidden, H8 PGOOD1, H9 FB1, H10 COMP0a, H11 COMP0b, J1 V_{OUT1} hidden, J2 V_{OUT1} hidden, J3 V_{OUT1} hidden, J4 V_{OUT1} hidden, J5 V_{IN} hidden, J6 V_{IN} hidden, J7 GND hidden, J8 RUN1, J9 GND hidden, J10 VOSNS1, J11 COMP1, K1 GND hidden, K2 GND hidden, K3 GND hidden, K4 GND hidden, K5 GND hidden, K6 GND hidden, K7 GND hidden, K8 TMON, K9 INTV_{CC12}, K10 FREQ12, K11 GND hidden, L1 V_{OUT2}, L2 V_{OUT2} hidden, L3 V_{OUT2} hidden, L4 V_{OUT2} hidden, L5 V_{IN}, L6 V_{IN} hidden, L7 GND hidden, L8 RUN2, L9 MODE/CLKIN12, L10 VOSNS2, L11 GND hidden, M1 V_{OUT2} hidden, M2 V_{OUT2} hidden, M3 V_{OUT2} hidden, M4 V_{OUT2} hidden, M5 GND hidden, M6 V_{IN} hidden, M7 GND hidden, M8 PGOOD2, M9 FB2, M10 GND hidden, M11 COMP2, N1 GND hidden, N2 GND hidden, N3 GND hidden, N4 GND hidden, N5 GND hidden, N6 GND hidden, N7 TRACK/SS2, N8 COMP3b, N9 COMP3a, N10 FB3, N11 VOSNS3^{+}, P1 GND hidden, P2 GND hidden, P3 GND hidden, P4 GND hidden, P5 GND hidden, P6 CLKOUT3, P7 RUN3, P8 FREQ3, P9 TRACK/SS3, P10 VOSNS3^{-}, P11 GND hidden, R1 V_{OUT3}, R2 V_{OUT3} hidden, R3 GND hidden, R4 GND hidden, R5 GND hidden, R6 PHMODE3, R7 PGOOD3, R8 MODE/CLKIN3, R9 SV_{IN3}, R10 V_{IN}, R11 INTV_{CC3}, T1 V_{OUT3} hidden, T2 V_{OUT3} hidden, T3 V_{OUT3} hidden, T4 GND hidden, T5 GND hidden, T6 GND hidden, T7 V_{IN} hidden, T8 V_{IN} hidden, T9 V_{IN} hidden, T10 V_{IN} hidden, T11 V_{IN} hidden, U1 V_{OUT3} hidden, U2 V_{OUT3} hidden, U3 V_{OUT3} hidden, U4 GND hidden, U5 GND hidden, U6 GND hidden, U7 GND hidden, U8 GND hidden, U9 GND hidden, U10 GND hidden, U11 GND hidden, V1 V_{OUT3} hidden, V2 V_{OUT3} hidden, V3 V_{OUT3} hidden, V4 GND hidden, V5 GND hidden, V6 GND hidden, V7 GND hidden, V8 GND hidden, V9 GND hidden, V10 GND hidden, V11 GND hidden, W1 V_{OUT3} hidden, W2 V_{OUT3} hidden, W3 V_{OUT3} hidden, W4 GND hidden, W5 GND hidden, W6 TSENSE3^{+}, W7 TSENSE3^{-}, W8 GND hidden, W9 GND hidden, W10 GND hidden, W11 GND hidden

## LTM8063
designator *  value LTM8063  Reference: U
ki_keywords: uModule DCDC; ki_description: 40VIN, 2A Silent Switcher µModule Regulator, BGA-28; ki_fp_filters: Analog*BGA*4.0x6.25mm*; Footprint: Package_BGA:Analog_BGA-28_4.0x6.25mm_Layout4x7_P0.8mm_Ball0.45mm_Pad0.4; Datasheet: https://www.analog.com/media/en/technical-documentation/data-sheets/8063fa.pdf
pins: A1 GND, A2 FB, A3 TR/SS, A4 GND hidden, B1 PG, B2 SYNC, B3 RUN, B4 VIN, C1 RT, C2 GND hidden, C3 GND hidden, C4 VIN, D1 GND hidden, D2 GND hidden, D3 GND hidden, D4 GND hidden, E1 GND hidden, E2 GND hidden, E3 GND hidden, E4 GND hidden, F1 VOUT, F2 VOUT hidden, F3 VOUT hidden, F4 VOUT hidden, G1 VOUT hidden, G2 VOUT hidden, G3 VOUT hidden, G4 VOUT hidden

## LV2862XDDC
designator *  value LV2862XDDC  Reference: U
ki_keywords: step down DCDC converter regulator; ki_description: 60V, 0.6A, stepdown, DC/DC converter, 770kHz; ki_fp_filters: SOT?23*; Footprint: Package_TO_SOT_SMD:SOT-23-6; Datasheet: https://www.ti.com/lit/ds/symlink/lv2862.pdf
pins: 1 CB, 2 GND, 3 FB, 4 ~{{SHDN}}, 5 VIN, 6 SW

## LV2862YDDC
designator *  value LV2862YDDC  Reference: U
ki_keywords: step down DCDC converter regulator; ki_description: 60V, 0.6A, stepdown, DC/DC converter, 2.1MHz; ki_fp_filters: SOT*23*; Footprint: Package_TO_SOT_SMD:SOT-23-6; Datasheet: https://www.ti.com/lit/ds/symlink/lv2862.pdf
pins: 1 CB, 2 GND, 3 FB, 4 ~{{SHDN}}, 5 VIN, 6 SW

## MAX777L
designator *  value MAX777L  Reference: U
ki_keywords: switching regulator boost step-up dc-dc; ki_description: 210mA, Low voltage input, step-up DC-DC converter, 5V output voltage, DIP-8/SO-8; ki_fp_filters: SOIC*3.9x4.9mm*P1.27mm* DIP*W7.62mm*; Datasheet: https://kanga.gerbilator.org/ICs/MAX777.pdf
pins: 1 ILIM, 2 IN, 3 AGND, 4 PGND, 5 LX, 6 OUT, 7 ~{{SHDN}}, 8 NC hidden

## MAX778L
designator *  value MAX778L  Reference: U
ki_keywords: switching regulator boost step-up dc-dc; ki_description: 210mA, Low voltage input, step-up DC-DC converter, 3V/3.3V output voltage, DIP-8/SO-8; ki_fp_filters: SOIC*3.9x4.9mm*P1.27mm* DIP*W7.62mm*; Datasheet: https://kanga.gerbilator.org/ICs/MAX777.pdf
pins: 1 ILIM, 2 IN, 3 AGND, 4 PGND, 5 LX, 6 OUT, 7 ~{{SHDN}}, 8 SEL
